# Altium footprint library bldc.PcbLib: 76 footprints (part 2 of 5)
Each footprint in its own frame and in the unit in brackets; x right, y up, seen from the top. Pads: shape width x height; smd on the part's side, far side on the other; paste and mask are expansions set on the pad; w line width, h text height; cw(c..) or ccw(c..) is an arc to the next point about the centre after c.
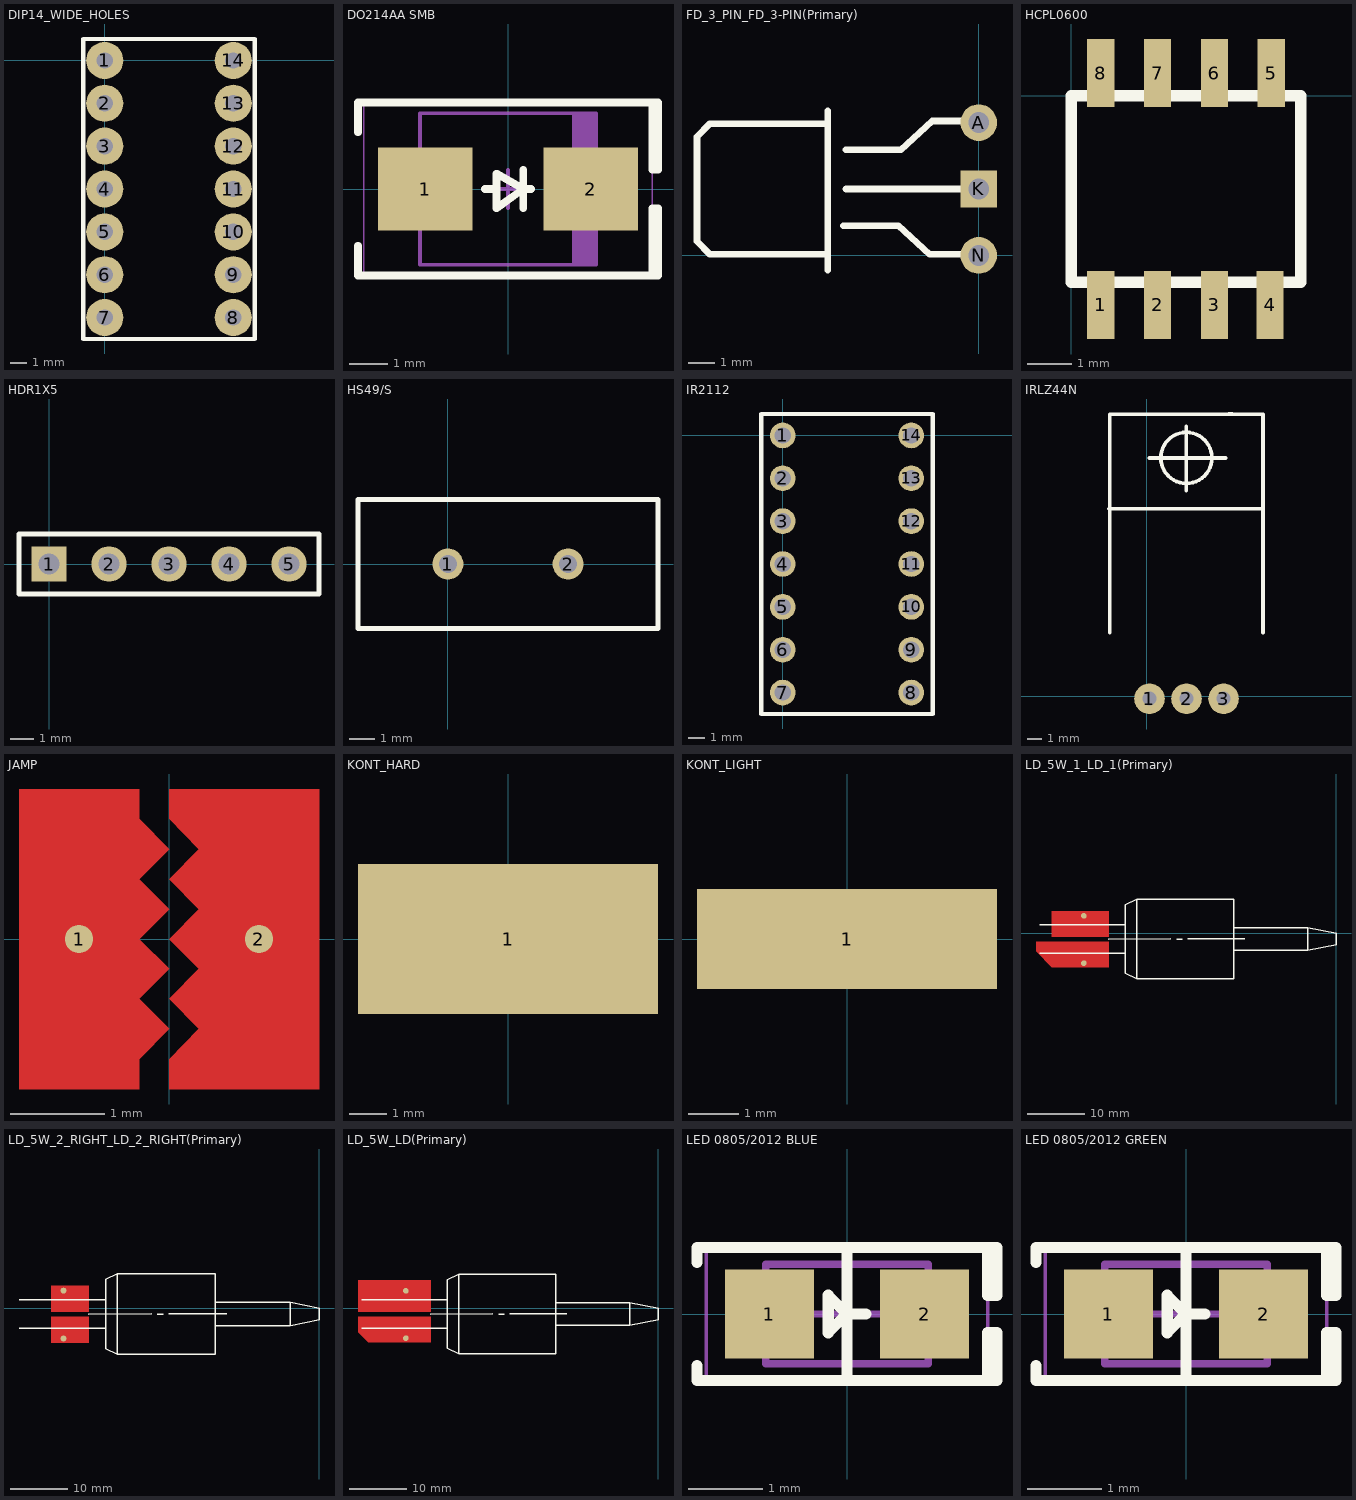
[diagram p1: the footprints below, top view; thin cyan lines are the x and y axes]

## DIP14_WIDE_HOLES [mm]
pads (14):
  round 2.2 hole 0.965: 1(0,0) 2(0,-2.54) 3(0,-5.08) 4(0,-7.62) 5(0,-10.16) 6(0,-12.7) 7(0,-15.24) 8(7.62,-15.24) 9(7.62,-12.7) 10(7.62,-10.16) 11(7.62,-7.62) 12(7.62,-5.08) 13(7.62,-2.54) 14(7.62,0)
Top Overlay:
  lines w0.254: -1.27,-16.51 8.89,-16.51 8.89,1.27 -1.27,1.27 -1.27,-16.51
3D body "DIP14-300.stp": height 6.6, standoff -2.03, extent -0.125,-17.465 7.745,2.225

## DO214AA SMB [mm] "Molded Diode, 2-Leads, Body 4.31x3.62mm, IPC Medium Density"
height 2.44
pads (2):
  rect 2.45x2.15 smd: 1(-2.15,0) 2(2.15,0)
Top Overlay:
  lines w0.2: -3.9,-1.475 -3.9,-2.25 3.9,-2.25 3.9,-0.5 3.75,-0.5 3.75,-2.25 ; -3.9,1.475 -3.9,2.25 3.9,2.25 3.9,0.5 3.75,0.5 3.75,2.25 ; -0.6,0 -0.3,0 ; 0.4,-0.5 0.4,0.5 ; 0.6,0 0.4,0 ; 0.4,0 -0.3,0.4 -0.3,-0.5 0.4,0
Mechanical 13:
  rectangle: 1.67,-1.97 2.285,1.97
  lines w0.1: -2.285,-1.97 2.285,-1.97 2.285,1.97 -2.285,1.97 -2.285,-1.97
Mechanical 15:
  lines w0.05: -3.75,-2.25 3.75,-2.25 3.75,2.25 -3.75,2.25 -3.75,-2.25
  lines w0.1: -0.5,0 0.5,0 ; 0,-0.5 0,0.5
3D body "SMB.STEP": height 2.4, standoff 0, extent -2.6,-1.799 2.6,1.8

## FD_3_PIN_FD_3-PIN(Primary) [mm]
pads (3):
  round 1.4 hole 0.8: A(0,5.08) N(0,0)
  rect 1.4x1.4 hole 0.8: K(0,2.54)
Top Overlay:
  lines w0.254: -5.78,-0.56 -5.78,5.54 ; -5.78,0.04 -10.28,0.04 -10.78,0.54 -10.78,4.54 -10.28,5.04 -5.78,5.04 ; -5.18,1.14 -3.08,1.14 -1.88,0.04 -0.08,0.04 ; -5.08,2.54 0,2.54 ; -5.08,4.04 -2.98,4.04 -1.78,5.14 0.02,5.14

## HCPL0600 [mil]
pads (8):
  rect 24x60 smd: 1(26,-184) 2(76,-184) 3(126,-184) 4(175,-184) 5(176,20) 6(126,20) 7(76,20) 8(26,20)
Top Overlay:
  lines w10: 0,-164 202,-164 202,0 0,0 0,-164
3D body: height 143, standoff 0, extent 0,-164 202,0

## HDR1X5 [mm] "Connector; Header; 5 Position"
pads (5):
  rect 1.5x1.5 hole 0.9: 1(0,0)
  round 1.5 hole 0.9: 2(2.54,0) 3(5.08,0) 4(7.62,0) 5(10.16,0)
Top Overlay:
  lines w0.2: -1.27,-1.27 11.43,-1.27 11.43,1.27 -1.27,1.27 -1.27,-1.27

## HS49/S [mm]
pads (2):
  round 1.2 hole 0.7: 1(0,0) 2(4.65,0)
Top Overlay:
  lines w0.2: -3.475,-2.5 -3.475,2.5 8.125,2.5 8.125,0.25 8.125,-2.5 -3.475,-2.5

## IR2112 [mil]
pads (14):
  round 60 hole 38: 1(0,0) 2(0,-100) 3(0,-200) 4(0,-300) 5(0,-400) 6(0,-500) 7(0,-600) 8(300,-600) 9(300,-500) 10(300,-400) 11(300,-300) 12(300,-200) 13(300,-100) 14(300,0)
Top Overlay:
  lines w10: -50,-650 350,-650 350,50 -50,50 -50,-650

## IRLZ44N [mm]
pads (3):
  round 2.1 hole 0.965: 1(0.17,-0.17) 2(2.71,-0.17) 3(5.25,-0.17)
Top Overlay:
  circle w0.254: c2.7,16.34 r1.75
  lines w0.254: -2.6,12.85 7.95,12.85 ; -2.55,4.35 -2.55,19.34 7.95,19.34 7.95,4.35 ; 0.15,16.34 5.4,16.34 ; 2.65,16.34 2.7,16.34 ; 2.7,14.1 2.7,18.5 ; 5.6,19.35 5.8,19.35 5.85,19.35
3D body "TO-220-H.stp": height 4.7, standoff -3.5, extent -2.56,-0.45 7.98,19.32

## JAMP [mm]
pads (2):
  round 0.3 smd: 1(-0.951,0) 2(0.951,0)
Top Layer:
  region: -1.585,-1.585 -0.317,-1.585 -0.317,-1.268 0,-0.951 -0.317,-0.634 0,-0.317 -0.317,0 0,0.317 -0.317,0.634 0,0.951 -0.317,1.268 -0.317,1.585 -1.585,1.585
  region: 0,1.268 0.317,0.951 0,0.634 0.317,0.317 0,0 0.317,-0.317 0,-0.634 0.317,-0.951 0,-1.268 0,-1.585 1.585,-1.585 1.585,1.585 0,1.585

## KONT_HARD [mm]
pads (1):
  rect 8x4 smd: 1(0,0)

## KONT_LIGHT [mm]
pads (1):
  rect 6x2 smd: 1(0,0)

## LD_5W_1_LD_1(Primary) [mm]
pads (2):
  round 1 smd: A(-44.289,3.044) K(-44.289,-5.256)
Top Layer:
  region: -39.9,3.9 -49.9,3.9 -49.9,-0.6 -39.9,-0.6
  region: -39.9,-1.5 -52.7,-1.5 -52.7,-3.2 -49.9,-6 -39.9,-6
Top Overlay:
  lines w0.254: -52.002,-3.516 -37.002,-3.516 ; -52.002,1.484 -37.002,1.484 ; -40.002,-1.016 -29.002,-1.016 ; -28.002,-1.016 -27.002,-1.016 ; -26.002,-1.016 -16.002,-1.016 ; -18.002,-3.016 -5.002,-3.016 ; -18.002,0.984 -5.002,0.984 ; -35.002,-8.016 -37.002,-7.016 -37.002,4.984 -35.002,5.984 ; -35.002,-8.016 -35.002,5.984 ; -35.002,-8.016 -18.002,-8.016 -18.002,5.984 -35.002,5.984 ; -5.002,-3.016 -5.002,0.984 ; -5.002,-3.016 -0.002,-2.016 -0.002,-0.016 -5.002,0.984

## LD_5W_2_RIGHT_LD_2_RIGHT(Primary) [mm]
pads (2):
  round 1 smd: A(-44.289,3.044) K(-44.289,-5.256)
Top Layer:
  region: -39.9,3.9 -46.4,3.9 -46.4,-0.6 -39.9,-0.6
  region: -39.9,-1.5 -46.4,-1.5 -46.4,-6 -39.9,-6
Top Overlay:
  lines w0.254: -52.002,-3.516 -37.002,-3.516 ; -52.002,1.484 -37.002,1.484 ; -40.002,-1.016 -29.002,-1.016 ; -28.002,-1.016 -27.002,-1.016 ; -26.002,-1.016 -16.002,-1.016 ; -18.002,-3.016 -5.002,-3.016 ; -18.002,0.984 -5.002,0.984 ; -35.002,-8.016 -18.002,-8.016 -18.002,5.984 -35.002,5.984 ; -35.002,-8.016 -35.002,5.984 ; -35.002,-8.016 -37.002,-7.016 -37.002,4.984 -35.002,5.984 ; -5.002,-3.016 -0.002,-2.016 -0.002,-0.016 -5.002,0.984 ; -5.002,-3.016 -5.002,0.984

## LD_5W_LD(Primary) [mm]
pads (2):
  round 1 smd: A(-44.289,3.044) K(-44.289,-5.256)
Top Layer:
  region: -39.9,-1.5 -52.7,-1.5 -52.7,-4.2 -50.9,-6 -39.9,-6
  region: -39.9,4.9 -52.7,4.9 -52.7,-0.6 -39.9,-0.6
Top Overlay:
  lines w0.254: -52.002,-3.516 -37.002,-3.516 ; -52.002,1.484 -37.002,1.484 ; -40.002,-1.016 -29.002,-1.016 ; -28.002,-1.016 -27.002,-1.016 ; -26.002,-1.016 -16.002,-1.016 ; -18.002,-3.016 -5.002,-3.016 ; -18.002,0.984 -5.002,0.984 ; -35.002,-8.016 -37.002,-7.016 -37.002,4.984 -35.002,5.984 ; -35.002,-8.016 -35.002,5.984 ; -35.002,-8.016 -18.002,-8.016 -18.002,5.984 -35.002,5.984 ; -5.002,-3.016 -5.002,0.984 ; -5.002,-3.016 -0.002,-2.016 -0.002,-0.016 -5.002,0.984

## LED 0805/2012 BLUE [mm] "Chip Diode, 2-Leads, Body 2.00x1.25mm, IPC Medium Density"
height 0.7
pads (2):
  rect 1.2x1.2 smd: 1(-1.05,0) 2(1.05,0)
Top Overlay:
  lines w0.15: -2.032,-0.7 -2.032,-0.9 1.905,-0.9 ; -2.032,0.7 -2.032,0.9 1.905,0.9 ; 0,-0.9 0,0.9 ; 0.254,0 0,0 ; 0,0 -0.254,0.254 -0.254,-0.254 0,0 ; 1.905,-0.9 2.032,-0.9 2.032,-0.254 1.905,-0.254 1.905,-0.9 ; 1.905,0.9 2.032,0.9 2.032,0.254 1.905,0.254 1.905,0.9
Mechanical 13:
  lines w0.1: -1.1,-0.675 -1.1,0.675 1.1,0.675 1.1,-0.675 -1.1,-0.675
Mechanical 15:
  lines w0.05: -1.905,-0.95 -1.905,0.95 1.905,0.95 1.905,-0.95 -1.905,-0.95
  lines w0.1: -0.5,0 0.5,0 ; 0,-0.5 0,0.5
3D body "LED 0805 Lens BLUE.STEP": height 0.9, standoff 0.3, extent -0.65,-0.625 0.65,0.625
3D body "LED 0805 Base BLUE.STEP": height 0.4, standoff 0, extent -1,-0.625 1,0.625

## LED 0805/2012 GREEN [mm] "Chip Diode, 2-Leads, Body 2.00x1.25mm, IPC Medium Density"
height 0.7
pads (2):
  rect 1.2x1.2 smd: 1(-1.05,0) 2(1.05,0)
Top Overlay:
  lines w0.15: -2.032,-0.7 -2.032,-0.9 1.905,-0.9 ; -2.032,0.7 -2.032,0.9 1.905,0.9 ; 0,-0.9 0,0.9 ; 0.254,0 0,0 ; 0,0 -0.254,-0.254 -0.254,0.254 0,0 ; 1.905,-0.9 2.032,-0.9 2.032,-0.254 1.905,-0.254 1.905,-0.9 ; 1.905,0.9 2.032,0.9 2.032,0.254 1.905,0.254 1.905,0.9
Mechanical 13:
  lines w0.1: -1.1,-0.675 -1.1,0.675 1.1,0.675 1.1,-0.675 -1.1,-0.675
Mechanical 15:
  lines w0.05: -1.905,-0.95 -1.905,0.95 1.905,0.95 1.905,-0.95 -1.905,-0.95
  lines w0.1: -0.5,0 0.5,0 ; 0,-0.5 0,0.5
3D body "LED 0805 Lens GREEN.STEP": height 0.9, standoff 0.3, extent -0.65,-0.625 0.65,0.625
3D body "LED 0805 Base GREEN.STEP": height 0.4, standoff 0, extent -1,-0.625 1,0.625